# Altium footprint library bethu.PcbLib: 628 footprints (part 16 of 40)
Each footprint in its own frame and in the unit in brackets; x right, y up, seen from the top. Pads: shape width x height; smd on the part's side, far side on the other; paste and mask are expansions set on the pad; w line width, h text height; cw(c..) or ccw(c..) is an arc to the next point about the centre after c.
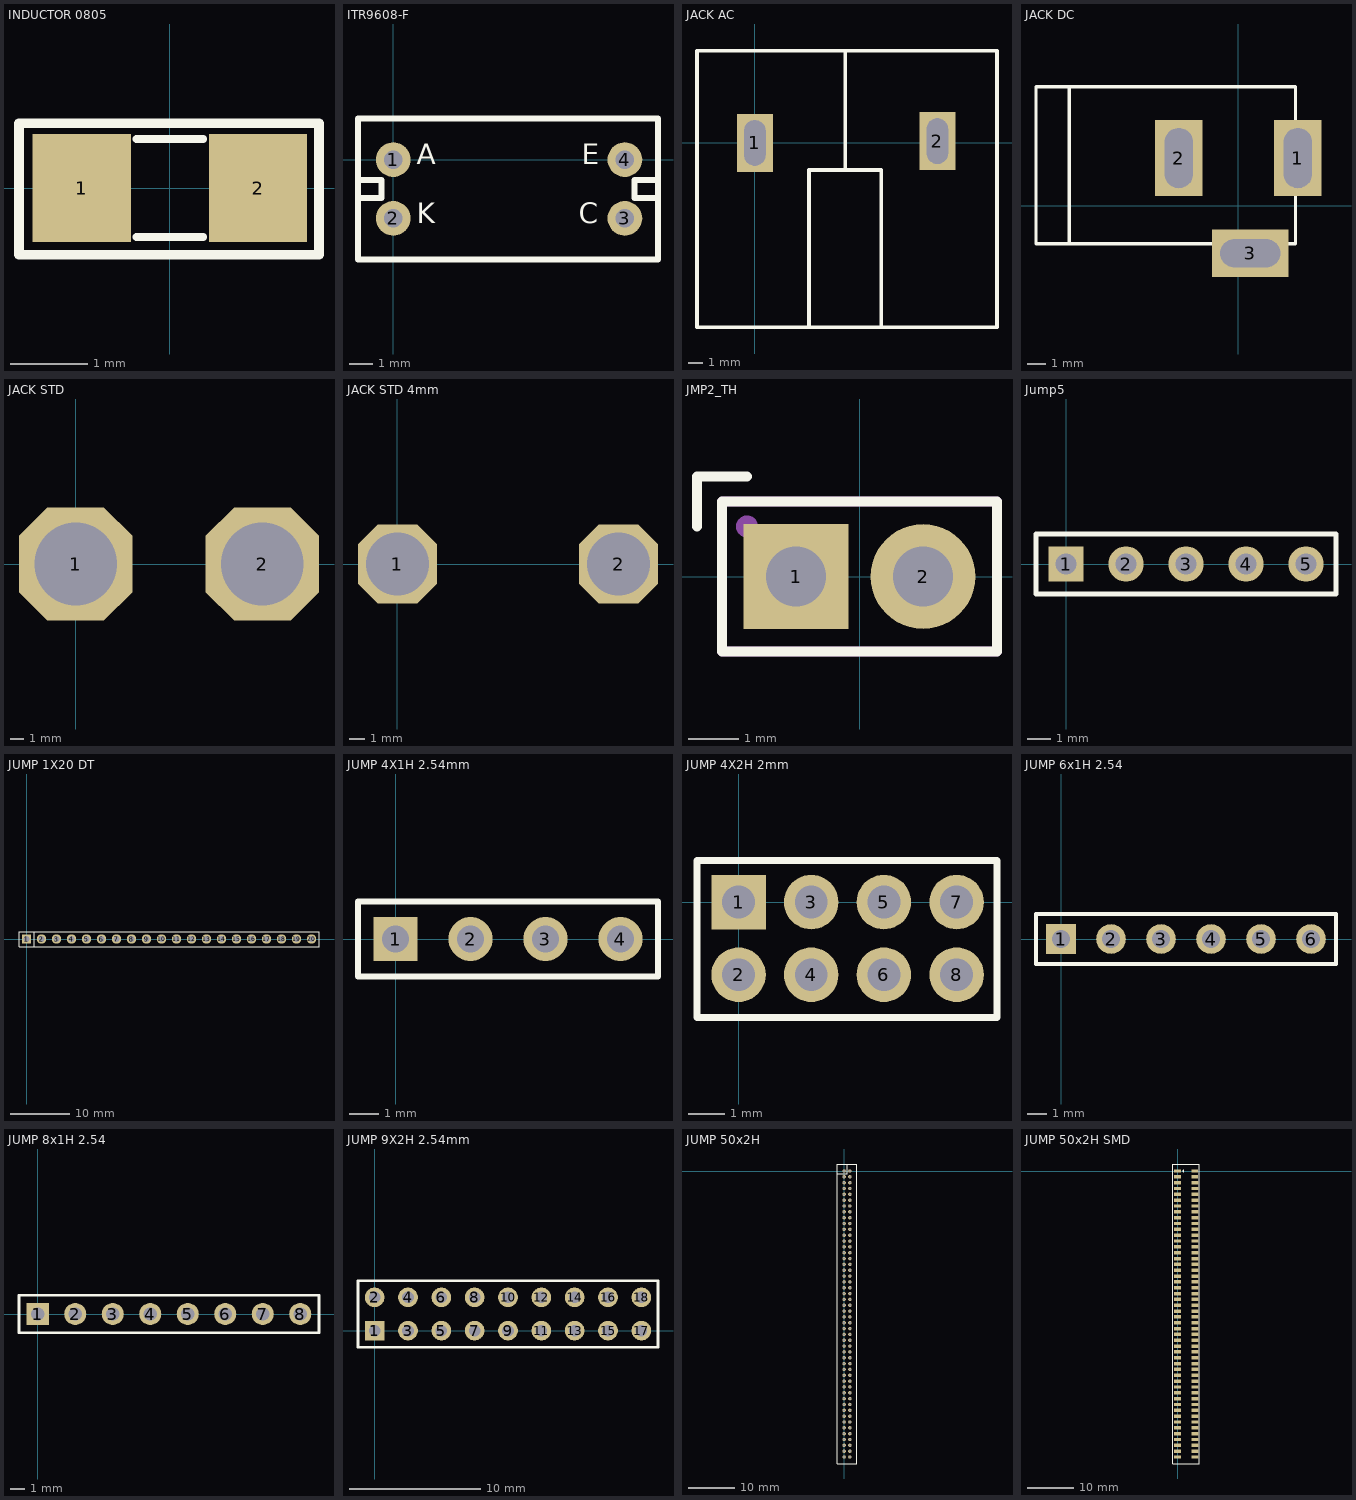
[diagram p15: the footprints below, top view; thin cyan lines are the x and y axes]

## INDUCTOR 0805 [mil]
height 50
pads (2):
  rect 50x55 smd: 1(-45,0) 2(45,0)
Top Overlay:
  lines w4: -17,-25 17,-25 ; -17,25 17,25
  lines w5: -77,-34 -77,33 76,33 76,-34 -77,-34
3D body "45635.stp": height 19.68, standoff 0, extent -39.36,-24.6 39.38,24.6

## ITR9608-F [mm]
pads (4):
  round 1.5 hole 0.8: 1(0,0) 2(0,-2.54) 3(10,-2.54) 4(10,0)
Top Overlay:
  lines w0.254: -1.524,-1.651 -0.508,-1.651 -0.508,-0.889 -1.524,-0.889 ; 11.43,-1.651 10.414,-1.651 10.414,-0.889 11.43,-0.889 ; -1.524,-4.318 -1.524,1.778 11.43,1.778 11.43,-4.318 -1.524,-4.318
  text "C" at 8.001,-3.048 h1.52
  text "E" at 8.128,-0.508 h1.52
  text "K" at 1.016,-3.048 h1.52
  text "A" at 1.016,-0.508 h1.52
3D body "matdoc.SLDPRT": height 10, standoff -6, extent -1.524,-4.27 11.476,1.73

## JACK AC [mil] "Jack AC input"
pads (2):
  rect 100x160 hole 59.06 slot 125.98 at 90 deg: 1(0,0) 2(505,5)
Top Overlay:
  lines w10: 150,-510 150,-75 350,-75 350,-510 ; 250,-75 250,255 ; -160,-510 -160,255 670,255 670,-510 -160,-510
3D body "JACK_1 (1).STEP": height 897.6, standoff -145.71, extent -158.39,-512.72 668.39,255

## JACK DC [mm] "Jac DC input"
height 5.08
pads (3):
  rect 2.54x4.064 hole 1.5 slot 3.2 at 90 deg: 1(3.175,2.54) 2(-3.175,2.54)
  rect 4.064x2.54 hole 1.5 slot 3.2 at 0 deg: 3(0.635,-2.54)
Top Overlay:
  lines w0.178: -9.017,-2.032 -9.017,6.35 ; -10.795,-2.032 -10.795,6.35 3.048,6.35 3.048,-2.032 -10.795,-2.032
3D body "SW3dPS-dc range - dc connector[4840.2201].STEP": height 11.02, standoff -3.48, extent -10.423,-2.67 3.404,6.836

## JACK STD [mm] "Connector; Header; 2 Position"
pads (2):
  oct 8.5x8.5 hole 6.2: 1(0,0) 2(14,0)
3D body "redversion.STEP": height 11, standoff -11.2, extent 9.542,-4.428 18.542,4.572
3D body "redversion.STEP": height 11, standoff -11.2, extent -4.5,-4.5 4.5,4.5

## JACK STD 4mm [mm] "Connector; Header; 2 Position"
pads (2):
  oct 5x5 hole 4: 1(0,0) 2(14,0)

## JMP2_TH [mm]
pads (2):
  rect 2.1x2.1 hole 1.2: 1(-1.27,0)
  round 2.1 hole 1.2: 2(1.27,0)
Top Overlay:
  lines w0.2: -3.25,1 -3.25,2 -2.25,2 ; -2.75,-1.5 2.75,-1.5 2.75,1.5 -2.75,1.5 -2.75,-1.5
Mechanical 13:
  circle w0.254: c-2.25,1 r0.093
  lines w0.2: -2.75,-1.5 2.75,-1.5 2.75,1.5 -2.75,1.5 -2.75,-1.5
  text ".Designator" at -4.998,-0.333 h1

## Jump5 [mm]
pads (5):
  rect 1.5x1.5 hole 0.9: 1(0,0)
  round 1.5 hole 0.9: 2(2.54,0) 3(5.08,0) 4(7.62,0) 5(10.16,0)
Top Overlay:
  lines w0.2: -1.27,-1.27 11.43,-1.27 11.43,1.27 -1.27,1.27 -1.27,-1.27

## JUMP 1X20 DT [mm] "20 pins, 1 row, straight, gold plating"
height 8.54
pads (20):
  rect 1.6x1.6 hole 1.1: 1(0,0)
  round 1.6 hole 1.1: 2(2.54,0) 3(5.08,0) 4(7.62,0) 5(10.16,0) 6(12.7,0) 7(15.24,0) 8(17.78,0) 9(20.32,0) 10(22.86,0) 11(25.4,0) 12(27.94,0) 13(30.48,0) 14(33.02,0) 15(35.56,0) 16(38.1,0) 17(40.64,0) 18(43.18,0) 19(45.72,0) 20(48.26,0)
Top Overlay:
  lines w0.2: 1.27,-1.27 1.27,1.27 ; -1.27,-1.27 49.53,-1.27 49.53,1.27 0.635,1.27 -1.27,1.27 -1.27,-1.27
3D body "61302011121.stp": height 8.54, standoff -3, extent -1.27,-1.27 49.53,1.27

## JUMP 4X1H 2.54mm [mm] "Connector; Header; 4 Position"
pads (4):
  rect 1.5x1.5 hole 0.9: 1(0,0)
  round 1.5 hole 0.9: 2(2.54,0) 3(5.08,0) 4(7.62,0)
Top Overlay:
  lines w0.2: -1.27,-1.27 -1.27,1.27 8.89,1.27 8.89,-1.27 -1.27,-1.27
3D body "User Library-RM254_4pin.STEP": height 6.02, standoff -3.1, extent -1.27,-1.27 8.89,1.27

## JUMP 4X2H 2mm [mm] "Connector; Header; 4 Position"
pads (8):
  rect 1.5x1.5 hole 0.9: 1(0,0)
  round 1.5 hole 0.9: 2(0,-2) 3(2,0) 4(2,-2) 5(4,0) 6(4,-2) 7(6,0) 8(6,-2)
Top Overlay:
  lines w0.2: -1.143,-3.175 7.112,-3.175 7.112,1.143 -1.143,1.143 -1.143,-3.175

## JUMP 6x1H 2.54 [mm]
pads (6):
  rect 1.5x1.5 hole 0.9: 1(0,0)
  round 1.5 hole 0.9: 2(2.54,0) 3(5.08,0) 4(7.62,0) 5(10.16,0) 6(12.7,0)
Top Overlay:
  lines w0.2: -1.27,-1.27 13.97,-1.27 13.97,1.27 -1.27,1.27 -1.27,-1.27
3D body "User Library-RM254_4pin.STEP": height 6.02, standoff -3.1, extent -1.27,-1.27 8.89,1.27
3D body "User Library-RM254_4pin.STEP": height 6.02, standoff -3.1, extent 3.81,-1.27 13.97,1.27

## JUMP 8x1H 2.54 [mm]
pads (8):
  rect 1.5x1.5 hole 0.9: 1(0,0)
  round 1.5 hole 0.9: 2(2.54,0) 3(5.08,0) 4(7.62,0) 5(10.16,0) 6(12.7,0) 7(15.24,0) 8(17.78,0)
Top Overlay:
  lines w0.2: -1.27,-1.27 -1.27,1.27 19.05,1.27 19.05,-1.27 -1.27,-1.27
3D body "User Library-RM254_4pin.STEP": height 6.02, standoff -3.1, extent 8.89,-1.27 19.05,1.27
3D body "User Library-RM254_4pin.STEP": height 6.02, standoff -3.1, extent -1.27,-1.27 8.89,1.27

## JUMP 9X2H 2.54mm [mm]
pads (18):
  rect 1.5x1.5 hole 0.9: 1(0,0)
  round 1.5 hole 0.9: 2(0,2.54) 3(2.54,0) 4(2.54,2.54) 5(5.08,0) 6(5.08,2.54) 7(7.62,0) 8(7.62,2.54) 9(10.16,0) 10(10.16,2.54) 11(12.7,0) 12(12.7,2.54) 13(15.24,0) 14(15.24,2.54) 15(17.78,0) 16(17.78,2.54) 17(20.32,0) 18(20.32,2.54)
Top Overlay:
  lines w0.2: -1.27,-1.27 -1.27,3.81 21.59,3.81 21.59,-1.27 -1.27,-1.27
3D body "User Library-RM254_4pin.STEP": height 6.02, standoff -3.1, extent -1.27,-1.27 8.89,1.27
3D body "User Library-RM254_4pin.STEP": height 6.02, standoff -3.1, extent -1.27,1.27 8.89,3.81
3D body "User Library-RM254_4pin.STEP": height 6.02, standoff -3.1, extent 3.81,1.27 13.97,3.81
3D body "User Library-RM254_4pin.STEP": height 6.02, standoff -3.1, extent 6.35,-1.27 16.51,1.27
3D body "User Library-RM254_4pin.STEP": height 6.02, standoff -3.1, extent 11.43,1.27 21.59,3.81
3D body "User Library-RM254_4pin.STEP": height 6.02, standoff -3.1, extent 11.43,-1.27 21.59,1.27

## JUMP 50x2H [mm]
pads (100):
  round 0.75 hole 0.45: 1(0,0) 2(1.27,0) 3(0,-1.27) 4(1.27,-1.27) 5(0,-2.54) 6(1.27,-2.54) 7(0,-3.81) 8(1.27,-3.81) 9(0,-5.08) 10(1.27,-5.08) 11(0,-6.35) 12(1.27,-6.35) 13(0,-7.62) 14(1.27,-7.62) 15(0,-8.89) 16(1.27,-8.89) 17(0,-10.16) 18(1.27,-10.16) 19(0,-11.43) 20(1.27,-11.43) 21(0,-12.7) 22(1.27,-12.7) 23(0,-13.97) 24(1.27,-13.97) 25(0,-15.24) 26(1.27,-15.24) 27(0,-16.51) 28(1.27,-16.51) 29(0,-17.78) 30(1.27,-17.78) 31(0,-19.05) 32(1.27,-19.05) 33(0,-20.32) 34(1.27,-20.32) 35(0,-21.59) 36(1.27,-21.59) 37(0,-22.86) 38(1.27,-22.86) 39(0,-24.13) 40(1.27,-24.13) 41(0,-25.4) 42(1.27,-25.4) 43(0,-26.67) 44(1.27,-26.67) 45(0,-27.94) 46(1.27,-27.94) 47(0,-29.21) 48(1.27,-29.21) 49(0,-30.48) 50(1.27,-30.48) 51(0,-31.75) 52(1.27,-31.75) 53(0,-33.02) 54(1.27,-33.02) 55(0,-34.29) 56(1.27,-34.29) 57(0,-35.56) 58(1.27,-35.56) 59(0,-36.83) 60(1.27,-36.83) 61(0,-38.1) 62(1.27,-38.1) 63(0,-39.37) 64(1.27,-39.37) 65(0,-40.64) 66(1.27,-40.64) 67(0,-41.91) 68(1.27,-41.91) 69(0,-43.18) 70(1.27,-43.18) 71(0,-44.45) 72(1.27,-44.45) 73(0,-45.72) 74(1.27,-45.72) 75(0,-46.99) 76(1.27,-46.99) 77(0,-48.26) 78(1.27,-48.26) 79(0,-49.53) 80(1.27,-49.53) 81(0,-50.8) 82(1.27,-50.8) 83(0,-52.07) 84(1.27,-52.07) 85(0,-53.34) 86(1.27,-53.34) 87(0,-54.61) 88(1.27,-54.61) 89(0,-55.88) 90(1.27,-55.88) 91(0,-57.15) 92(1.27,-57.15) 93(0,-58.42) 94(1.27,-58.42) 95(0,-59.69) 96(1.27,-59.69) 97(0,-60.96) 98(1.27,-60.96) 99(0,-62.23) 100(1.27,-62.23)
Top Overlay:
  lines w0.2: -1.524,-0.635 0.635,-0.635 0.635,1.524 ; -1.524,-63.754 -1.524,1.524 2.794,1.524 2.794,-63.754 -1.524,-63.754

## JUMP 50x2H SMD [mm] "CFP, 100-Leads, Body 7.4x3.7mm (max), Pitch 1.27mm, IPC Medium Density"
height 2.5
pads (100):
  rect 1.47x0.74 smd: 1(0,0) 3(0,-1.27) 4(3.74,-1.27) 5(0,-2.54) 6(3.781,-2.54) 7(0,-3.81) 8(3.781,-3.81) 9(0,-5.08) 10(3.781,-5.08) 11(0,-6.35) 12(3.781,-6.35) 13(0,-7.62) 14(3.781,-7.62) 15(0,-8.89) 16(3.781,-8.89) 17(0,-10.16) 18(3.781,-10.16) 19(0,-11.43) 20(3.781,-11.43) 21(0,-12.7) 22(3.781,-12.7) 23(0,-13.97) 24(3.781,-13.97) 25(0,-15.24) 26(3.781,-15.24) 27(0,-16.51) 28(3.781,-16.51) 29(0,-17.78) 30(3.781,-17.78) 31(0,-19.05) 32(3.781,-19.05) 33(0,-20.32) 34(3.781,-20.32) 35(0,-21.59) 36(3.781,-21.59) 37(0,-22.86) 38(3.781,-22.86) 39(0,-24.13) 40(3.781,-24.13) 41(0,-25.4) 42(3.781,-25.4) 43(0,-26.67) 44(3.781,-26.67) 45(0,-27.94) 46(3.781,-27.94) 47(0,-29.21) 48(3.781,-29.21) 49(0,-30.48) 50(3.781,-30.48) 51(0,-31.75) 52(3.781,-31.75) 53(0,-33.02) 54(3.781,-33.02) 55(0,-34.29) 56(3.781,-34.29) 57(0,-35.56) 58(3.781,-35.56) 59(0,-36.83) 60(3.781,-36.83) 61(0,-38.1) 62(3.781,-38.1) 63(0,-39.37) 64(3.781,-39.37) 65(0,-40.64) 66(3.781,-40.64) 67(0,-41.91) 68(3.781,-41.91) 69(0,-43.18) 70(3.781,-43.18) 71(0,-44.45) 72(3.781,-44.45) 73(0,-45.72) 74(3.781,-45.72) 75(0,-46.99) 76(3.781,-46.99) 77(0,-48.26) 78(3.781,-48.26) 79(0,-49.53) 80(3.781,-49.53) 81(0,-50.8) 82(3.781,-50.8) 83(0,-52.07) 84(3.781,-52.07) 85(0,-53.34) 86(3.781,-53.34) 87(0,-54.61) 88(3.781,-54.61) 89(0,-55.88) 90(3.781,-55.88) 91(0,-57.15) 92(3.781,-57.15) 93(0,-58.42) 94(3.781,-58.42) 95(0,-59.69) 96(3.781,-59.69) 97(0,-60.96) 98(3.781,-60.96) 99(0,-62.23) 100(3.781,-62.23)
  rect 1.44x0.74 smd: 2(3.74,0)
Top Overlay:
  circle w0.25: c1.272,0 r0.125
  lines w0.2: -1.016,-63.754 -1.016,1.524 4.699,1.524 4.699,-63.754 -1.016,-63.754
3D body "User Library-1_27x1_27-SMD-female-2x2.STEP": height 4.5, standoff 0, extent -0.395,-63.055 4.205,-60.135
3D body "User Library-1_27x1_27-SMD-female-2x4.STEP": height 4.5, standoff 0, extent -0.395,-60.515 4.205,-55.055
3D body "User Library-1_27x1_27-SMD-female-2x4.STEP": height 4.5, standoff 0, extent -0.395,-45.211 4.205,-39.751
3D body "User Library-1_27x1_27-SMD-female-2x4.STEP": height 4.5, standoff 0, extent -0.395,-40.195 4.205,-34.735
3D body "User Library-1_27x1_27-SMD-female-2x4.STEP": height 4.5, standoff 0, extent -0.395,-55.435 4.205,-49.975
3D body "User Library-1_27x1_27-SMD-female-2x4.STEP": height 4.5, standoff 0, extent -0.395,-50.355 4.205,-44.895
3D body "User Library-1_27x1_27-SMD-female-2x4.STEP": height 4.5, standoff 0, extent -0.395,-35.115 4.205,-29.655
3D body "User Library-1_27x1_27-SMD-female-2x4.STEP": height 4.5, standoff 0, extent -0.395,-30.035 4.205,-24.575
3D body "User Library-1_27x1_27-SMD-female-2x4.STEP": height 4.5, standoff 0, extent -0.395,-24.955 4.205,-19.495
3D body "User Library-1_27x1_27-SMD-female-2x4.STEP": height 4.5, standoff 0, extent -0.395,-19.811 4.205,-14.351
3D body "User Library-1_27x1_27-SMD-female-2x4.STEP": height 4.5, standoff 0, extent -0.395,-14.795 4.205,-9.335
3D body "User Library-1_27x1_27-SMD-female-2x4.STEP": height 4.5, standoff 0, extent -0.395,-9.651 4.205,-4.191
3D body "User Library-1_27x1_27-SMD-female-2x4.STEP": height 4.5, standoff 0, extent -0.395,-4.635 4.205,0.825